# Altium integrated library WE-RJ45_LAN_rev16b.intlib: 51 symbols
Pins are listed as number, name and electrical type; pins without a type are passive.

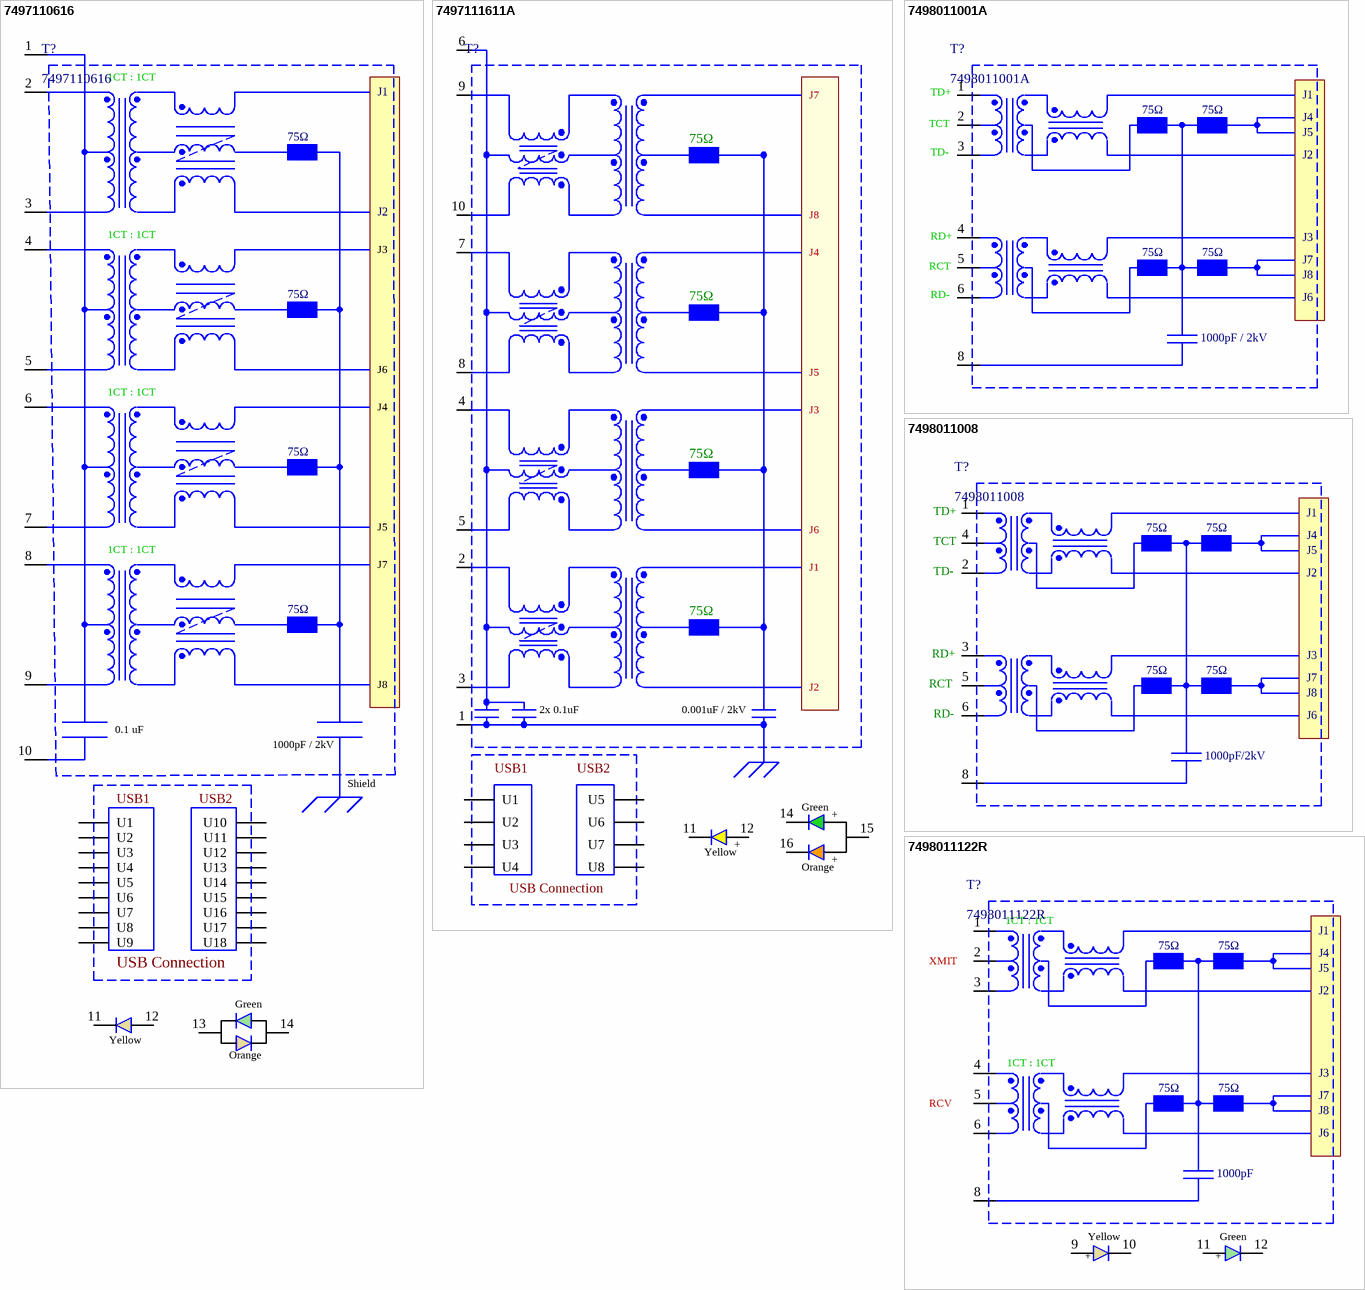
[diagram p0: symbols 7497110616 to 7498011122R]

## 7497110616
designator T?
RJ45 LAN Transformer, 10/100/1000 Base-T Multiport & USB; Manufacturer: Wurth Elektronik; ComponentLink1 Description: Manufacturer; ComponentLink2 Description: Datasheet; ComponentLink1 URL: http://www.we-online.com; ComponentLink2 URL: http://katalog.we-online.de/pbs/datasheet/7497110616.pdf; Created By: Baojun Chen; Created Date: 18-Aug-15; PartNo: 7497110616
footprint 7497110616 (RJ45 LAN Transformer, 10/100/1000 Base-T Multiport & USB)
pins: 1, 2, 3, 4, 5, 6, 7, 8, 9, 10, 11, 12, 13, 14, U1, U2, U3, U4, U5, U6, U7, U8, U9, U10, U11, U12, U13, U14, U15, U16, U17, U18
text: 1CT : 1CT; J1; 75Ω; J2; J3; J6; J4; J5; J7; J8; 0.1 uF; 1000pF / 2kV; Shield; USB1; USB2; USB Connection; Green; Yellow; Orange

## 7497111611A
designator T?  (value not drawn)
RJ45 LAN Transformer, 10/100/1000 Base-T Multiport & USB; Manufacturer: Wurth Elektronik; PartNo: 7497111611A; ComponentLink1Description: Manufacturer; ComponentLink1URL: http://www.we-online.de; Created by: Baojun Chen; Created Date: 18.Aug.2015; ComponentLink2Description: Datasheet; ComponentLink2URL: http://katalog.we-online.de/pbs/datasheet/7497111611A.pdf
footprint 7497111611A (RJ45 LAN Transformer, 10/100/1000 Base-T Multiport & USB)
pins: 1, 2, 3, 4, 5, 6, 7, 8, 9, 10, 11, 12, 14, 15, 16, U1, U2, U3, U4, U5, U6, U7, U8
text: J7; 75Ω; J8; J4; J5; J3; J6; J1; J2; 2x 0.1uF; 0.001uF / 2kV; USB1; USB2; Green; +; Yellow; Orange; USB Connection

## 7498011001A
designator T?
RJ45 LAN Transformer, 10/100/1000 Base-T SMD; Manufacturer: Wurth Elektronik; ComponentLink1 Description: Manufacturer; ComponentLink2 Description: Datasheet; ComponentLink1 URL: http://www.we-online.com; ComponentLink2 URL: http://katalog.we-online.de/pbs/datasheet/7498011001A.pdf; Created By: Baojun Chen; Created Date: 18-Aug-15; PartNo: 7498011001A
footprint 7498011001A (RJ45 LAN Transformer, 10/100/1000 Base-T SMD)
pins: 1 TD+, 2 TCT, 3 TD-, 4 RD+, 5 RCT, 6 RD-, 8
text: J1; 75Ω; J4; J5; J2; J3; J7; J8; J6; 1000pF / 2kV

## 7498011008
designator T?
RJ45 LAN Transformer, 10/100/1000 Base-T SMD; Manufacturer: Wurth Elektronik; ComponentLink1 Description: Manufacturer; ComponentLink2 Description: Datasheet; ComponentLink1 URL: http://www.we-online.com; ComponentLink2 URL: http://katalog.we-online.de/pbs/datasheet/7498011008.pdf; Created By: Baojun Chen; Created Date: 18-Aug-15; PartNo: 7498011008
footprint 7498011008 (RJ45 LAN Transformer, 10/100/1000 Base-T SMD)
pins: 1 TD+, 2 TD-, 3 RD+, 4 TCT, 5 RCT, 6 RD-, 8
text: J1; 75Ω; J4; J5; J2; J3; J7; J8; J6; 1000pF/2kV

## 7498011122R
designator T?
RJ45 LAN Transformer, 10/100/1000 Base-T SMD; Manufacturer: Wurth Elektronik; ComponentLink1 Description: Manufacturer; ComponentLink2 Description: Datasheet; ComponentLink1 URL: http://www.we-online.com; ComponentLink2 URL: http://katalog.we-online.de/pbs/datasheet/7498011122R.pdf; Created By: Baojun Chen; Created Date: 18-Aug-15; PartNo: 7498011122R
footprint 7498011122R (RJ45 LAN Transformer, 10/100/1000 Base-T SMD)
pins: 1, 2, 3, 4, 5, 6, 8, 9, 10, 11, 12
text: 1CT : 1CT; J1; 75Ω; J4; XMIT; J5; J2; J3; J7; RCV; J8; J6; 1000pF; Yellow; Green; +

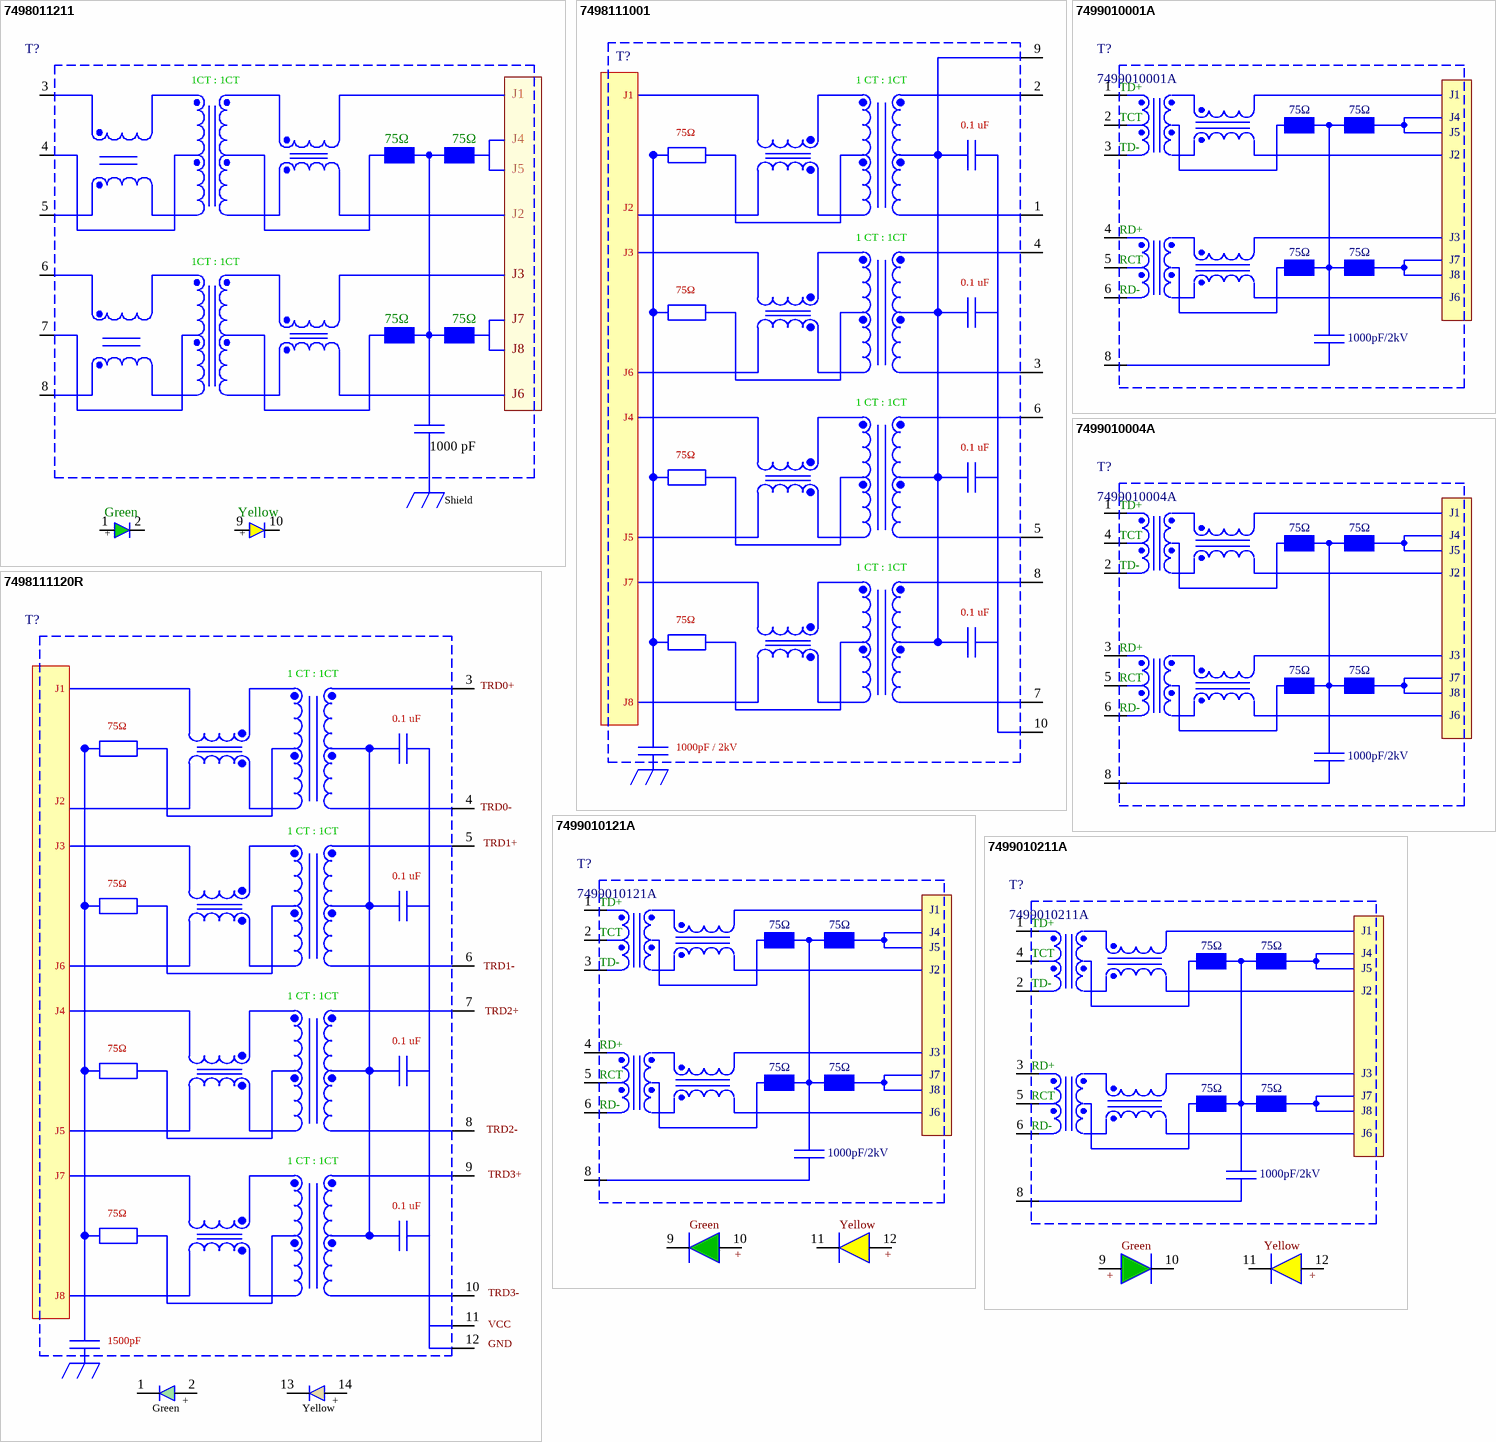
[diagram p1: symbols 7498011211 to 7499010211A]

## 7498011211
designator T?  (value not drawn)
RJ45 LAN Transformer, 10/100/1000 Base-T SMD; Manufacturer: Wurth Elektronik; PartNo: 7498011211; ComponentLink1Description: Manufacturer; ComponentLink1URL: http://www.we-online.de; Created by: Baojun Chen; Created Date: 18.Aug.2015; ComponentLink2Description: Datasheet; ComponentLink2URL: http://katalog.we-online.de/pbs/datasheet/7498011211.pdf
footprint 7498011211 (RJ45 LAN Transformer, 10/100/1000 Base-T SMD)
pins: 1, 2, 3, 4, 5, 6, 7, 8, 9, 10
text: 1CT : 1CT; J1; 75Ω; J4; J5; J2; J3; J7; J8; J6; 1000 pF; Shield; Green; Yellow; +

## 7498111001
designator T?  (value not drawn)
RJ45 LAN Transformer, 10/100/1000 Base-T SMD; Manufacturer: Wurth Elektronik; PartNo: 7498111001; ComponentLink1Description: Manufacturer; ComponentLink1URL: http://www.we-online.de; Created by: Baojun Chen; Created Date: 18.Aug.2015; ComponentLink2Description: Datasheet; ComponentLink2URL: http://katalog.we-online.de/pbs/datasheet/7498111001.pdf
footprint 7498111001 (RJ45 LAN Transformer, 10/100/1000 Base-T SMD)
pins: 1, 2, 3, 4, 5, 6, 7, 8, 9, 10
text: 1 CT : 1CT; J1; 0.1 uF; 75Ω; J2; J3; J6; J4; J5; J7; J8; 1000pF / 2kV

## 7498111120R
designator T?  (value not drawn)
RJ45 LAN Transformer, 10/100/1000 Base-T SMD; Manufacturer: Wurth Elektronik; PartNo: 7498111120R; ComponentLink1Description: Manufacturer; ComponentLink1URL: http://www.we-online.de; Created by: Baojun Chen; Created Date: 18.Aug.2015; ComponentLink2Description: Datasheet; ComponentLink2URL: http://katalog.we-online.de/pbs/datasheet/7498111120R.pdf
footprint 7498111120R (RJ45 LAN Transformer, 10/100/1000 Base-T SMD)
pins: 1, 2, 3 TRD0+, 4 TRD0-, 5 TRD1+, 6 TRD1-, 7 TRD2+, 8 TRD2-, 9 TRD3+, 10 TRD3-, 11 VCC, 12 GND, 13, 14
text: 1 CT : 1CT; J1; 0.1 uF; 75Ω; J2; J3; J6; J4; J5; J7; J8; 1500pF; +; Green; Yellow

## 7499010001A
designator T?
RJ45 LAN Transformer, 10/100 Base-T; Manufacturer: Wurth Elektronik; ComponentLink1 Description: Manufacturer; ComponentLink2 Description: Datasheet; ComponentLink1 URL: http://www.we-online.com; ComponentLink2 URL: http://katalog.we-online.de/pbs/datasheet/7499010001A.pdf; Created By: Baojun Chen; Created Date: 13-Aug-15; PartNo: 7499010001A
footprint 7499010001A (RJ45 LAN Transformer, 10/100 Base-T)
pins: 1 TD+, 2 TCT, 3 TD-, 4 RD+, 5 RCT, 6 RD-, 8
text: J1; 75Ω; J4; J5; J2; J3; J7; J8; J6; 1000pF/2kV

## 7499010004A
designator T?
RJ45 LAN Transformer, 10/100 Base-T; Manufacturer: Wurth Elektronik; ComponentLink1 Description: Manufacturer; ComponentLink2 Description: Datasheet; ComponentLink1 URL: http://www.we-online.com; ComponentLink2 URL: http://katalog.we-online.de/pbs/datasheet/7499010004A.pdf; Created By: Baojun Chen; Created Date: 14-Aug-15; PartNo: 7499010004A
footprint 7499010004A (RJ45 LAN Transformer, 10/100 Base-T)
pins: 1 TD+, 2 TCT, 3 TD-, 4 RD+, 5 RCT, 6 RD-, 8
text: J1; 75Ω; J4; J5; J2; J3; J7; J8; J6; 1000pF/2kV

## 7499010121A
designator T?
RJ45 LAN Transformer, 10/100 Base-T; Manufacturer: Wurth Elektronik; ComponentLink1 Description: Manufacturer; ComponentLink2 Description: Datasheet; ComponentLink1 URL: http://www.we-online.com; ComponentLink2 URL: http://katalog.we-online.de/pbs/datasheet/7499010121A.pdf; Created By: Baojun Chen; Created Date: 13-Aug-15; PartNo: 7499010121A
footprint 7499010121A (RJ45 LAN Transformer, 10/100 Base-T)
pins: 1 TD+, 2 TCT, 3 TD-, 4 RD+, 5 RCT, 6 RD-, 8, 9, 10, 11, 12
text: J1; 75Ω; J4; J5; J2; J3; J7; J8; J6; 1000pF/2kV; Green; Yellow; +

## 7499010211A
designator T?
RJ45 LAN Transformer, 10/100 Base-T; Manufacturer: Wurth Elektronik; ComponentLink1 Description: Manufacturer; ComponentLink2 Description: Datasheet; ComponentLink1 URL: http://www.we-online.com; ComponentLink2 URL: http://katalog.we-online.de/pbs/datasheet/7499010211A.pdf; Created By: Baojun Chen; Created Date: 14-Aug-15; PartNo: 7499010211A
footprint 7499010211A (RJ45 LAN Transformer, 10/100 Base-T)
pins: 1 TD+, 2 TCT, 3 TD-, 4 RD+, 5 RCT, 6 RD-, 8, 9, 10, 11, 12
text: J1; 75Ω; J4; J5; J2; J3; J7; J8; J6; 1000pF/2kV; Green; Yellow; +

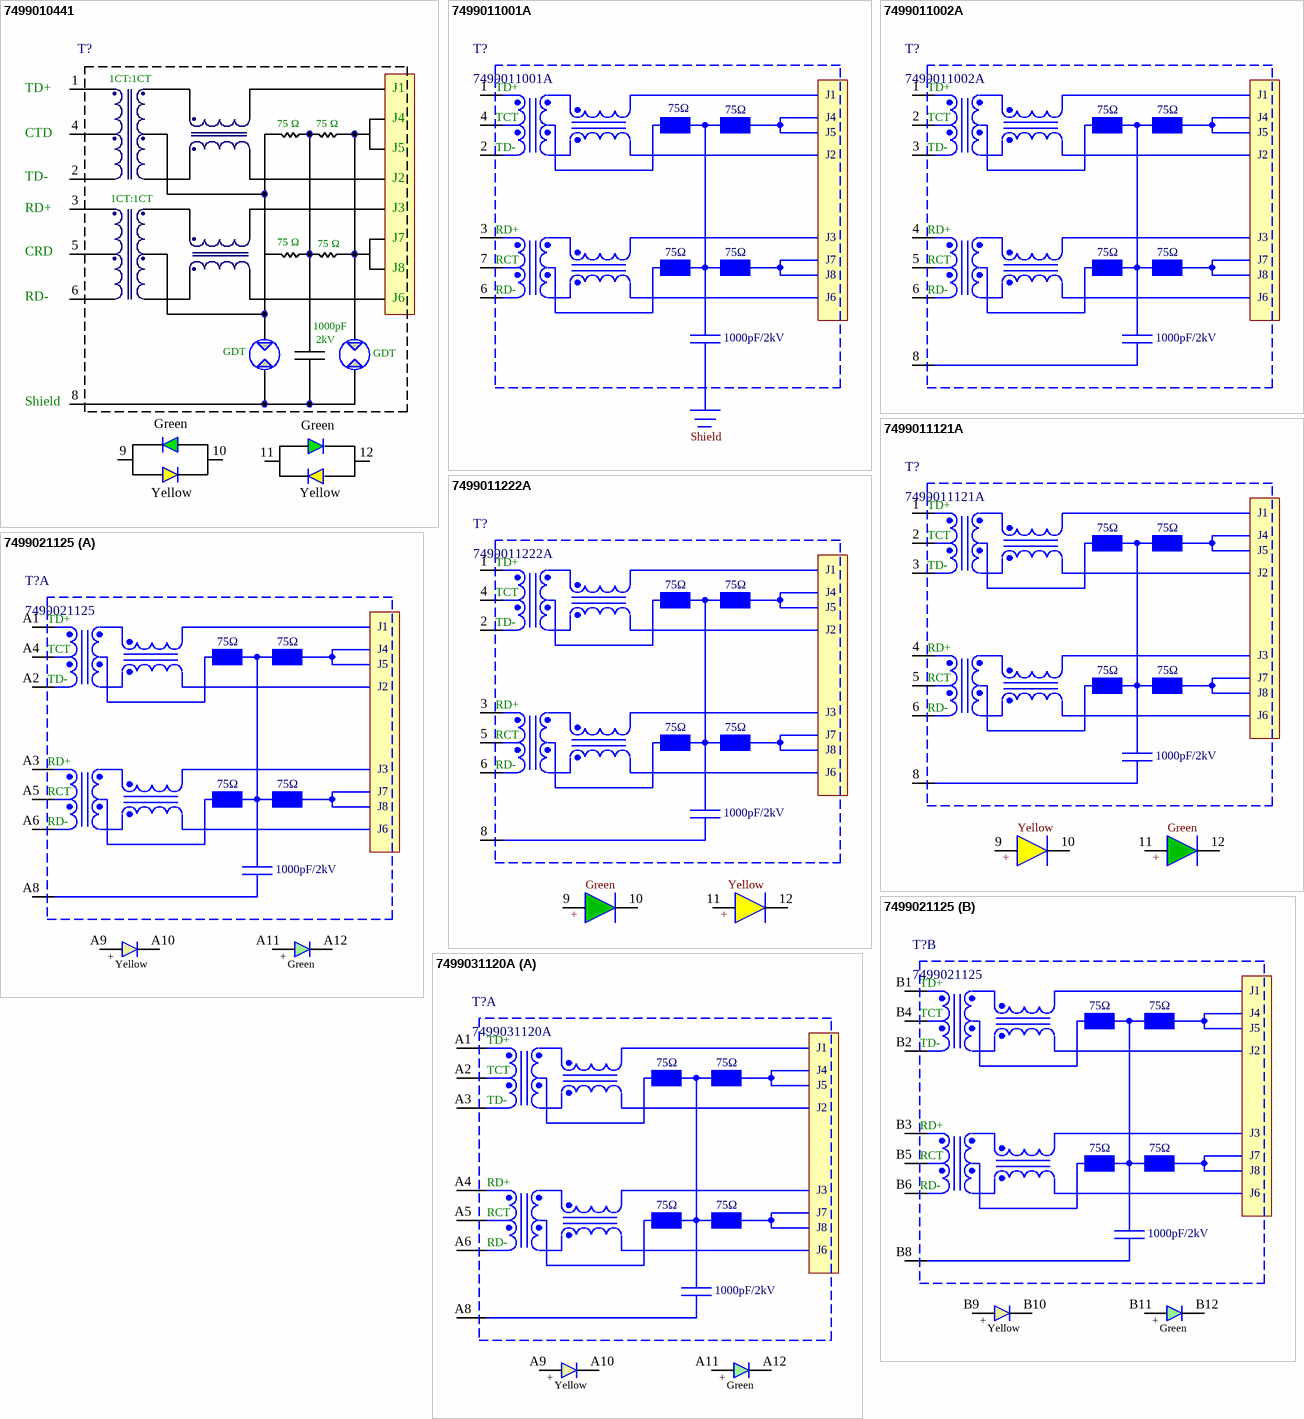
[diagram p2: symbols 7499010441 to 7499031120A]

## 7499010441
designator T?, comment 360-400 V (DC)  (value not drawn)
RJ45 LAN Transformer, Surge Protection; PartNo: 7499010441; Manufacturer: Wurth Elektronik; (Input Voltage) Ui: 360-400 V (DC); ComponentLink1Description: Manufacturer; ComponentLink1URL: http://www.we-online.de; Created by: Baojun Chen; Created Date: Dec.2015; ComponentLink2Description: Datasheet; ComponentLink2URL: http://katalog.we-online.de/pbs/datasheet/7499010441.pdf
footprint 7499010441 (RJ45 LAN CONNECTOR with Surge Protection,  THT, Body 16.04 X 21.30 mm)
pins: 1 TD+, 2 TD-, 3 RD+, 4 CTD, 5 CRD, 6 RD-, 8 Shield, 9, 10, 11, 12
text: 1CT:1CT; J1; J4; 75 Ω; J5; J2; J3; J7; J8; J6; 1000pF; 2kV; GDT; Green; Yellow

## 7499011001A
designator T?
RJ45 LAN Transformer, 10/100 Base-T; Manufacturer: Wurth Elektronik; ComponentLink1 Description: Manufacturer; ComponentLink2 Description: Datasheet; ComponentLink1 URL: http://www.we-online.com; ComponentLink2 URL: http://katalog.we-online.de/pbs/datasheet/7499011001A.pdf; Created By: Baojun Chen; Created Date: 14-Aug-15; PartNo: 7499011001A
footprint 7499011001A (RJ45 LAN Transformer, 10/100 Base-T)
pins: 1 TD+, 2 TCT, 3 TD-, 4 RD+, 6 RD-, 7
text: J1; 75Ω; J4; J5; J2; J3; RCT; J7; J8; J6; 1000pF/2kV; Shield

## 7499011002A
designator T?
RJ45 LAN Transformer, 10/100 Base-T; Manufacturer: Wurth Elektronik; ComponentLink1 Description: Manufacturer; ComponentLink2 Description: Datasheet; ComponentLink1 URL: http://www.we-online.com; ComponentLink2 URL: http://katalog.we-online.de/pbs/datasheet/7499011002A.pdf; Created By: Baojun Chen; Created Date: 13-Aug-15; PartNo: 7499011002A
footprint 7499011002A (RJ45 LAN Transformer, 10/100 Base-T)
pins: 1 TD+, 2 TCT, 3 TD-, 4 RD+, 5 RCT, 6 RD-, 8
text: J1; 75Ω; J4; J5; J2; J3; J7; J8; J6; 1000pF/2kV

## 7499011121A
designator T?
RJ45 LAN Transformer, 10/100 Base-T; Manufacturer: Wurth Elektronik; ComponentLink1 Description: Manufacturer; ComponentLink2 Description: Datasheet; ComponentLink1 URL: http://www.we-online.com; ComponentLink2 URL: http://katalog.we-online.de/pbs/datasheet/7499011121A.pdf; Created By: Baojun Chen; Created Date: 13-Aug-15; PartNo: 7499011121A
footprint 7499011121A (RJ45 LAN Transformer, 10/100 Base-T)
pins: 1 TD+, 2 TCT, 3 TD-, 4 RD+, 5 RCT, 6 RD-, 8, 9, 10, 11, 12
text: J1; 75Ω; J4; J5; J2; J3; J7; J8; J6; 1000pF/2kV; Yellow; Green; +

## 7499011222A
designator T?
RJ45 LAN Transformer, 10/100 Base-T; Manufacturer: Wurth Elektronik; ComponentLink1 Description: Manufacturer; ComponentLink2 Description: Datasheet; ComponentLink1 URL: http://www.we-online.com; ComponentLink2 URL: http://katalog.we-online.de/pbs/datasheet/7499011222A.pdf; Created By: Baojun Chen; Created Date: 14-Aug-15; PartNo: 7499011222A
footprint 7499011222A (RJ45 LAN Transformer, 10/100 Base-T)
pins: 1 TD+, 2 TCT, 3 TD-, 4 RD+, 5 RCT, 6 RD-, 8, 9, 10, 11, 12
text: J1; 75Ω; J4; J5; J2; J3; J7; J8; J6; 1000pF/2kV; Green; Yellow; +

## 7499021125
designator T?
RJ45 LAN Transformer, 10/100/1000 Base-T Multiport & USB; Manufacturer: Wurth Elektronik; ComponentLink1 Description: Manufacturer; ComponentLink2 Description: Datasheet; ComponentLink1 URL: http://www.we-online.com; ComponentLink2 URL: http://katalog.we-online.de/pbs/datasheet/7499021125.pdf; Created By: Baojun Chen; Created Date: 18-Aug-15; PartNo: 7499021125
footprint 7499021125 (RJ45 LAN Transformer, 10/100/1000 Base-T Multiport & USB)
part A pins: A1 TD+, A2 TD-, A3 RD+, A4 TCT, A5 RCT, A6 RD-, A8 8, A9 9, A10 10, A11 11, A12 12
part B pins: B1 TD+, B2 TD-, B3 RD+, B4 TCT, B5 RCT, B6 RD-, B8 8, B9 9, B10 10, B11 11, B12 12
part A text: J1; 75Ω; J4; J5; J2; J3; J7; J8; J6; 1000pF/2kV; +; Yellow; Green
part B text: J1; 75Ω; J4; J5; J2; J3; J7; J8; J6; 1000pF/2kV; +; Yellow; Green

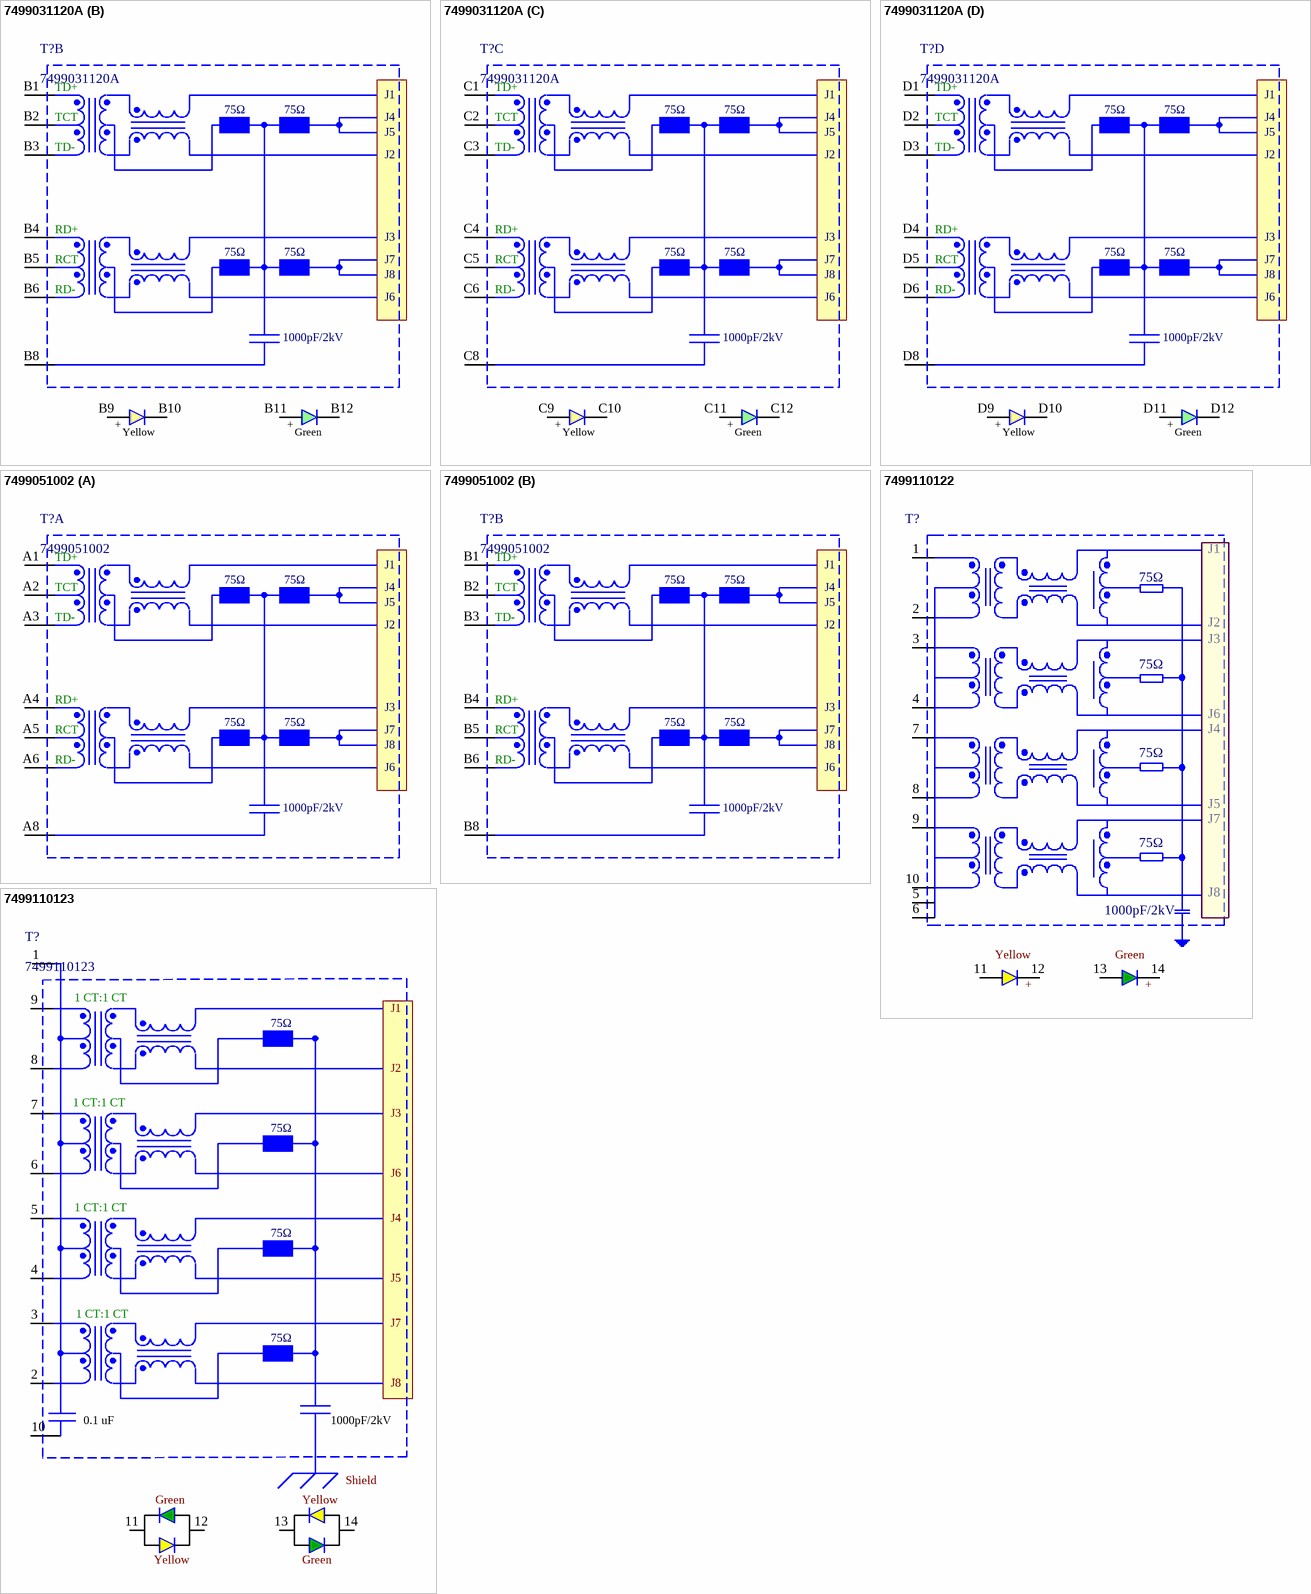
[diagram p3: symbols 7499031120A to 7499110123]

## 7499031120A
designator T?
RJ45 LAN Transformer, 10/100/1000 Base-T Multiport & USB; Manufacturer: Wurth Elektronik; ComponentLink1 Description: Manufacturer; ComponentLink2 Description: Datasheet; ComponentLink1 URL: http://www.we-online.com; ComponentLink2 URL: http://katalog.we-online.de/pbs/datasheet/7499031120A.pdf; Created By: Baojun Chen; Created Date: 18-Aug-15; PartNo: 7499031120A
footprint 7499031120A (RJ45 LAN Transformer, 10/100/1000 Base-T Multiport & USB)
part A pins: A1 TD+, A2 TCT, A3 TD-, A4 RD+, A5 RCT, A6 RD-, A8, A9, A10, A11, A12
part B pins: B1 TD+, B2 TCT, B3 TD-, B4 RD+, B5 RCT, B6 RD-, B8, B9, B10, B11, B12
part C pins: C1 TD+, C2 TCT, C3 TD-, C4 RD+, C5 RCT, C6 RD-, C8, C9, C10, C11, C12
part D pins: D1 TD+, D2 TCT, D3 TD-, D4 RD+, D5 RCT, D6 RD-, D8, D9, D10, D11, D12
part A text: J1; 75Ω; J4; J5; J2; J3; J7; J8; J6; 1000pF/2kV; +; Yellow; Green
part B text: J1; 75Ω; J4; J5; J2; J3; J7; J8; J6; 1000pF/2kV; +; Yellow; Green
part C text: J1; 75Ω; J4; J5; J2; J3; J7; J8; J6; 1000pF/2kV; +; Yellow; Green
part D text: J1; 75Ω; J4; J5; J2; J3; J7; J8; J6; 1000pF/2kV; +; Yellow; Green

## 7499051002
designator T?
RJ45 LAN Transformer, 10/100/1000 Base-T Multiport & USB; Manufacturer: Wurth Elektronik; ComponentLink1 Description: Manufacturer; ComponentLink2 Description: Datasheet; ComponentLink1 URL: http://www.we-online.com; ComponentLink2 URL: http://katalog.we-online.de/pbs/datasheet/7499051002.pdf; Created By: Baojun Chen; Created Date: 18-Aug-15; PartNo: 7499051002
footprint 7499051002 (RJ45 LAN Transformer, 10/100/1000 Base-T Multiport & USB)
part A pins: A1 TD+, A2 TCT, A3 TD-, A4 RD+, A5 RCT, A6 RD-, A8
part B pins: B1 TD+, B2 TCT, B3 TD-, B4 RD+, B5 RCT, B6 RD-, B8
part A text: J1; 75Ω; J4; J5; J2; J3; J7; J8; J6; 1000pF/2kV
part B text: J1; 75Ω; J4; J5; J2; J3; J7; J8; J6; 1000pF/2kV

## 7499110122
designator T?  (value not drawn)
RJ45 LAN Transformer, 10/100/1000 Base-T; Manufacturer: Wurth Elektronik; PartNo: 7499110122; ComponentLink1Description: Manufacturer; ComponentLink1URL: http://www.we-online.de; Created by: Baojun Chen; Created Date: 14.Aug.2015; ComponentLink2Description: Datasheet; ComponentLink2URL: http://katalog.we-online.de/pbs/datasheet/7499110122.pdf
footprint 7499110122 (RJ45 LAN Transformer, 10/100/1000 Base-T)
pins: 1, 2, 3, 4, 5, 6, 7, 8, 9, 10, 11, 12, 13, 14
text: J1; 75Ω; J2; J3; J6; J4; J5; J7; J8; 1000pF/2kV; Yellow; Green; +

## 7499110123
designator T?
RJ45 LAN Transformer, 10/100/1000 Base-T; Manufacturer: Wurth Elektronik; ComponentLink1 Description: Manufacturer; ComponentLink2 Description: Datasheet; ComponentLink1 URL: http://www.we-online.com; ComponentLink2 URL: http://katalog.we-online.de/pbs/datasheet/7499110123.pdf; Created By: Baojun Chen; Created Date: 14-Aug-15; PartNo: 7499110123
footprint 7499110123 (RJ45 LAN Transformer, 10/100/1000 Base-T)
pins: 1, 2, 3, 4, 5, 6, 7, 8, 9, 10, 11, 12, 13, 14
1 alternate drawing of the same symbol
